# Altium footprint library domino-spring-clamp.PcbLib: 258 footprints (part 4 of 17)
Each footprint in its own frame and in the unit in brackets; x right, y up, seen from the top. Pads: shape width x height; smd on the part's side, far side on the other; paste and mask are expansions set on the pad; w line width, h text height; cw(c..) or ccw(c..) is an arc to the next point about the centre after c.
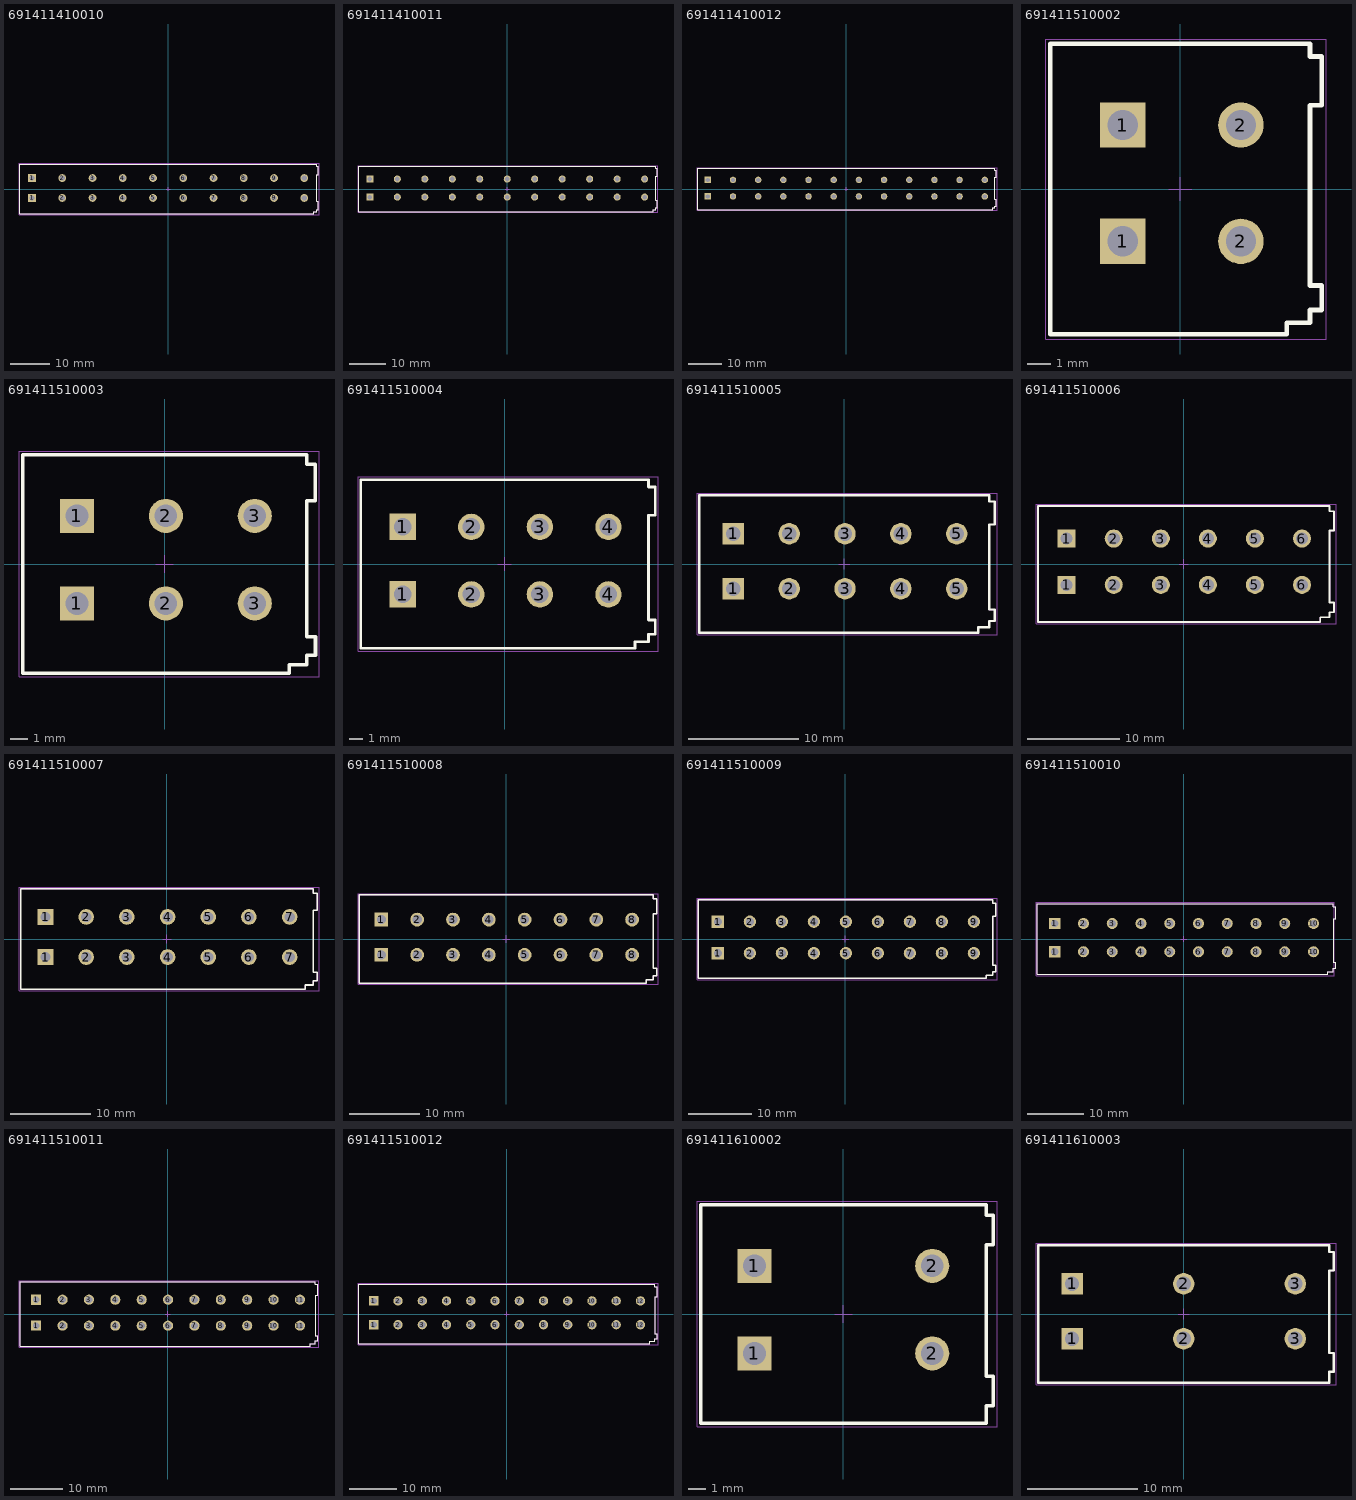
[diagram p3: the footprints below, top view; thin cyan lines are the x and y axes]

## 691411410010 [mm] "7.62 mm Screwless Horizontal Entry, 10p"
height 13.9
pads (20):
  rect 1.95x1.95 hole 1.3: 1(-34.29,-2.25) 1(-34.29,2.75)
  round 1.95 hole 1.3: 2(-26.67,-2.25) 2(-26.67,2.75) 3(-19.05,-2.25) 3(-19.05,2.75) 4(-11.43,-2.25) 4(-11.43,2.75) 5(-3.81,-2.25) 5(-3.81,2.75) 6(3.81,-2.25) 6(3.81,2.75) 7(11.43,-2.25) 7(11.43,2.75) 8(19.05,-2.25) 8(19.05,2.75) 9(26.67,-2.25) 9(26.67,2.75) 10(34.29,-2.25) 10(34.29,2.75)
Top Overlay:
  lines w0.2: -37.37,-6.25 36.71,-6.25 36.71,-5.75 37.37,-5.75 37.37,-5.2 37.79,-5.2 37.79,-3.1 37.37,-3.1 37.37,3.6 37.79,3.6 37.79,5.7 37.37,5.7 37.37,6.25 -37.37,6.25 -37.37,-6.25
Mechanical 13:
  lines w0.1: -37.37,-6.25 -37.37,6.25 37.37,6.25 37.37,5.7 37.79,5.7 37.79,3.6 37.37,3.6 37.37,-3.1 37.79,-3.1 37.79,-5.2 37.37,-5.2 37.37,-5.75 36.71,-5.75 36.71,-6.25 -37.37,-6.25
Mechanical 15:
  lines w0.05: -0.5,0 0.5,0 ; 0,-0.5 0,0.5 ; -37.57,-6.45 -37.57,6.45 37.99,6.45 37.99,-6.45 -37.57,-6.45
3D body "691411410010.stp": height 14, standoff -3.5, extent -37.37,-6.25 37.757,6.25

## 691411410011 [mm] "7.62 mm Screwless Horizontal Entry, 11p"
height 13.9
pads (22):
  rect 1.95x1.95 hole 1.3: 1(-38.1,-2.25) 1(-38.1,2.75)
  round 1.95 hole 1.3: 2(-30.48,-2.25) 2(-30.48,2.75) 3(-22.86,-2.25) 3(-22.86,2.75) 4(-15.24,-2.25) 4(-15.24,2.75) 5(-7.62,-2.25) 5(-7.62,2.75) 6(0,-2.25) 6(0,2.75) 7(7.62,-2.25) 7(7.62,2.75) 8(15.24,-2.25) 8(15.24,2.75) 9(22.86,-2.25) 9(22.86,2.75) 10(30.48,-2.25) 10(30.48,2.75) 11(38.1,-2.25) 11(38.1,2.75)
Top Overlay:
  lines w0.2: -41.18,-6.25 40.52,-6.25 40.52,-5.75 41.18,-5.75 41.18,-5.2 41.6,-5.2 41.6,-3.1 41.18,-3.1 41.18,3.6 41.6,3.6 41.6,5.7 41.18,5.7 41.18,6.25 -41.18,6.25 -41.18,-6.25
Mechanical 13:
  lines w0.1: -41.18,-6.25 -41.18,6.25 41.18,6.25 41.18,5.7 41.6,5.7 41.6,3.6 41.18,3.6 41.18,-3.1 41.6,-3.1 41.6,-5.2 41.18,-5.2 41.18,-5.75 40.52,-5.75 40.52,-6.25 -41.18,-6.25
Mechanical 15:
  lines w0.05: -0.5,0 0.5,0 ; 0,-0.5 0,0.5 ; -41.38,-6.45 -41.38,6.45 41.8,6.45 41.8,-6.45 -41.38,-6.45
3D body "691411410011.stp": height 14, standoff -3.5, extent -41.18,-6.25 41.564,6.25

## 691411410012 [mm] "7.62 mm Screwless Horizontal Entry, 12p"
height 13.9
pads (24):
  rect 1.95x1.95 hole 1.3: 1(-41.91,-2.25) 1(-41.91,2.75)
  round 1.95 hole 1.3: 2(-34.29,-2.25) 2(-34.29,2.75) 3(-26.67,-2.25) 3(-26.67,2.75) 4(-19.05,-2.25) 4(-19.05,2.75) 5(-11.43,-2.25) 5(-11.43,2.75) 6(-3.81,-2.25) 6(-3.81,2.75) 7(3.81,-2.25) 7(3.81,2.75) 8(11.43,-2.25) 8(11.43,2.75) 9(19.05,-2.25) 9(19.05,2.75) 10(26.67,-2.25) 10(26.67,2.75) 11(34.29,-2.25) 11(34.29,2.75) 12(41.91,-2.25) 12(41.91,2.75)
Top Overlay:
  lines w0.2: -44.99,-6.25 44.33,-6.25 44.33,-5.75 44.99,-5.75 44.99,-5.2 45.41,-5.2 45.41,-3.1 44.99,-3.1 44.99,3.6 45.41,3.6 45.41,5.7 44.99,5.7 44.99,6.25 -44.99,6.25 -44.99,-6.25
Mechanical 13:
  lines w0.1: -44.99,-6.25 -44.99,6.25 44.99,6.25 44.99,5.7 45.41,5.7 45.41,3.6 44.99,3.6 44.99,-3.1 45.41,-3.1 45.41,-5.2 44.99,-5.2 44.99,-5.75 44.33,-5.75 44.33,-6.25 -44.99,-6.25
Mechanical 15:
  lines w0.05: -0.5,0 0.5,0 ; 0,-0.5 0,0.5 ; -45.19,-6.45 -45.19,6.45 45.61,6.45 45.61,-6.45 -45.19,-6.45
3D body "691411410012.stp": height 14, standoff -3.5, extent -44.99,-6.25 45.37,6.25

## 691411510002 [mm] "5.08 mm Screwless Horizontal Entry, 2p"
height 13.9
pads (4):
  rect 1.95x1.95 hole 1.3: 1(-2.47,-2.25) 1(-2.47,2.75)
  round 1.95 hole 1.3: 2(2.61,-2.25) 2(2.61,2.75)
Top Overlay:
  lines w0.2: -5.58,-6.25 4.58,-6.25 4.58,-5.75 5.58,-5.75 5.58,-5.2 6.08,-5.2 6.08,-4.15 5.58,-4.15 5.58,3.6 6.08,3.6 6.08,5.7 5.58,5.7 5.58,6.25 -5.58,6.25 -5.58,-6.25
Mechanical 13:
  lines w0.1: -5.58,-6.25 -5.58,6.25 5.58,6.25 5.58,5.7 6.08,5.7 6.08,3.6 5.58,3.6 5.58,-4.15 6.08,-4.15 6.08,-5.2 5.58,-5.2 5.58,-5.75 4.58,-5.75 4.58,-6.25 -5.58,-6.25
Mechanical 15:
  lines w0.05: -0.5,0 0.5,0 ; 0,-0.5 0,0.5 ; -5.78,-6.45 -5.78,6.45 6.28,6.45 6.28,-6.45 -5.78,-6.45
3D body "691411510002.stp": height 13.95, standoff -3.55, extent -5.58,-6.25 6.08,6.25

## 691411510003 [mm] "5.08 mm Screwless Horizontal Entry, 3p"
height 13.9
pads (6):
  rect 1.95x1.95 hole 1.3: 1(-5.01,-2.25) 1(-5.01,2.75)
  round 1.95 hole 1.3: 2(0.07,-2.25) 2(0.07,2.75) 3(5.15,-2.25) 3(5.15,2.75)
Top Overlay:
  lines w0.2: -8.12,-6.25 7.12,-6.25 7.12,-5.75 8.12,-5.75 8.12,-5.2 8.62,-5.2 8.62,-4.15 8.12,-4.15 8.12,3.6 8.62,3.6 8.62,5.7 8.12,5.7 8.12,6.25 -8.12,6.25 -8.12,-6.25
Mechanical 13:
  lines w0.1: -8.12,-6.25 -8.12,6.25 8.12,6.25 8.12,5.7 8.62,5.7 8.62,3.6 8.12,3.6 8.12,-4.15 8.62,-4.15 8.62,-5.2 8.12,-5.2 8.12,-5.75 7.12,-5.75 7.12,-6.25 -8.12,-6.25
Mechanical 15:
  lines w0.05: -0.5,0 0.5,0 ; 0,-0.5 0,0.5 ; -8.32,-6.45 -8.32,6.45 8.82,6.45 8.82,-6.45 -8.32,-6.45
3D body "691411510003.stp": height 13.95, standoff -3.55, extent -8.12,-6.25 8.62,6.25

## 691411510004 [mm] "5.08 mm Screwless Horizontal Entry, 4p"
height 13.9
pads (8):
  rect 1.95x1.95 hole 1.3: 1(-7.55,-2.25) 1(-7.55,2.75)
  round 1.95 hole 1.3: 2(-2.47,-2.25) 2(-2.47,2.75) 3(2.61,-2.25) 3(2.61,2.75) 4(7.69,-2.25) 4(7.69,2.75)
Top Overlay:
  lines w0.2: -10.66,-6.25 9.66,-6.25 9.66,-5.75 10.66,-5.75 10.66,-5.2 11.16,-5.2 11.16,-4.15 10.66,-4.15 10.66,3.6 11.16,3.6 11.16,5.7 10.66,5.7 10.66,6.25 -10.66,6.25 -10.66,-6.25
Mechanical 13:
  lines w0.1: -10.66,-6.25 -10.66,6.25 10.66,6.25 10.66,5.7 11.16,5.7 11.16,3.6 10.66,3.6 10.66,-4.15 11.16,-4.15 11.16,-5.2 10.66,-5.2 10.66,-5.75 9.66,-5.75 9.66,-6.25 -10.66,-6.25
Mechanical 15:
  lines w0.05: -0.5,0 0.5,0 ; 0,-0.5 0,0.5 ; -10.86,-6.45 -10.86,6.45 11.36,6.45 11.36,-6.45 -10.86,-6.45
3D body "691411510004.stp": height 13.95, standoff -3.55, extent -10.66,-6.25 11.16,6.25

## 691411510005 [mm] "5.08 mm Screwless Horizontal Entry, 5p"
height 13.9
pads (10):
  rect 1.95x1.95 hole 1.3: 1(-10.09,-2.25) 1(-10.09,2.75)
  round 1.95 hole 1.3: 2(-5.01,-2.25) 2(-5.01,2.75) 3(0.07,-2.25) 3(0.07,2.75) 4(5.15,-2.25) 4(5.15,2.75) 5(10.23,-2.25) 5(10.23,2.75)
Top Overlay:
  lines w0.2: -13.2,-6.25 12.2,-6.25 12.2,-5.75 13.2,-5.75 13.2,-5.2 13.7,-5.2 13.7,-4.15 13.2,-4.15 13.2,3.6 13.7,3.6 13.7,5.7 13.2,5.7 13.2,6.25 -13.2,6.25 -13.2,-6.25
Mechanical 13:
  lines w0.1: -13.2,-6.25 -13.2,6.25 13.2,6.25 13.2,5.7 13.7,5.7 13.7,3.6 13.2,3.6 13.2,-4.15 13.7,-4.15 13.7,-5.2 13.2,-5.2 13.2,-5.75 12.2,-5.75 12.2,-6.25 -13.2,-6.25
Mechanical 15:
  lines w0.05: -0.5,0 0.5,0 ; 0,-0.5 0,0.5 ; -13.4,-6.45 -13.4,6.45 13.9,6.45 13.9,-6.45 -13.4,-6.45
3D body "691411510005.stp": height 13.95, standoff -3.55, extent -13.2,-6.25 13.7,6.25

## 691411510006 [mm] "5.08 mm Screwless Horizontal Entry, 6p"
height 13.9
pads (12):
  rect 1.95x1.95 hole 1.3: 1(-12.63,-2.25) 1(-12.63,2.75)
  round 1.95 hole 1.3: 2(-7.55,-2.25) 2(-7.55,2.75) 3(-2.47,-2.25) 3(-2.47,2.75) 4(2.61,-2.25) 4(2.61,2.75) 5(7.69,-2.25) 5(7.69,2.75) 6(12.77,-2.25) 6(12.77,2.75)
Top Overlay:
  lines w0.2: -15.74,-6.25 -15.74,6.25 15.74,6.25 15.74,5.7 16.24,5.7 16.24,3.6 15.74,3.6 15.74,-4.15 16.24,-4.15 16.24,-5.2 15.74,-5.2 15.74,-5.75 14.74,-5.75 14.74,-6.25 -15.74,-6.25
Mechanical 13:
  lines w0.1: -15.74,-6.25 14.74,-6.25 14.74,-5.75 15.74,-5.75 15.74,-5.2 16.24,-5.2 16.24,-4.15 15.74,-4.15 15.74,3.6 16.24,3.6 16.24,5.7 15.74,5.7 15.74,6.25 -15.74,6.25 -15.74,-6.25
Mechanical 15:
  lines w0.05: -0.5,0 0.5,0 ; 0,-0.5 0,0.5 ; -15.94,-6.45 16.44,-6.45 16.44,6.45 -15.94,6.45 -15.94,-6.45
3D body "691411510006.stp": height 13.95, standoff -3.55, extent -15.74,-6.25 16.24,6.25

## 691411510007 [mm] "5.08 mm Screwless Horizontal Entry, 7p"
height 13.9
pads (14):
  rect 1.95x1.95 hole 1.3: 1(-15.17,-2.25) 1(-15.17,2.75)
  round 1.95 hole 1.3: 2(-10.09,-2.25) 2(-10.09,2.75) 3(-5.01,-2.25) 3(-5.01,2.75) 4(0.07,-2.25) 4(0.07,2.75) 5(5.15,-2.25) 5(5.15,2.75) 6(10.23,-2.25) 6(10.23,2.75) 7(15.31,-2.25) 7(15.31,2.75)
Top Overlay:
  lines w0.2: -18.28,-6.25 -18.28,6.25 18.28,6.25 18.28,5.7 18.78,5.7 18.78,3.6 18.28,3.6 18.28,-4.15 18.78,-4.15 18.78,-5.2 18.28,-5.2 18.28,-5.75 17.28,-5.75 17.28,-6.25 -18.28,-6.25
Mechanical 13:
  lines w0.1: -18.28,-6.25 17.28,-6.25 17.28,-5.75 18.28,-5.75 18.28,-5.2 18.78,-5.2 18.78,-4.15 18.28,-4.15 18.28,3.6 18.78,3.6 18.78,5.7 18.28,5.7 18.28,6.25 -18.28,6.25 -18.28,-6.25
Mechanical 15:
  lines w0.05: -0.5,0 0.5,0 ; 0,-0.5 0,0.5 ; -18.48,-6.45 18.98,-6.45 18.98,6.45 -18.48,6.45 -18.48,-6.45
3D body "691411510007.stp": height 13.95, standoff -3.55, extent -18.28,-6.25 18.78,6.25

## 691411510008 [mm] "5.08 mm Screwless Horizontal Entry, 8p"
height 13.9
pads (16):
  rect 1.95x1.95 hole 1.3: 1(-17.71,-2.25) 1(-17.71,2.75)
  round 1.95 hole 1.3: 2(-12.63,-2.25) 2(-12.63,2.75) 3(-7.55,-2.25) 3(-7.55,2.75) 4(-2.47,-2.25) 4(-2.47,2.75) 5(2.61,-2.25) 5(2.61,2.75) 6(7.69,-2.25) 6(7.69,2.75) 7(12.77,-2.25) 7(12.77,2.75) 8(17.85,-2.25) 8(17.85,2.75)
Top Overlay:
  lines w0.2: -20.82,-6.25 19.82,-6.25 19.82,-5.75 20.82,-5.75 20.82,-5.2 21.32,-5.2 21.32,-4.15 20.82,-4.15 20.82,3.6 21.32,3.6 21.32,5.7 20.82,5.7 20.82,6.25 -20.82,6.25 -20.82,-6.25
Mechanical 13:
  lines w0.1: -20.82,-6.25 -20.82,6.25 20.82,6.25 20.82,5.7 21.32,5.7 21.32,3.6 20.82,3.6 20.82,-4.15 21.32,-4.15 21.32,-5.2 20.82,-5.2 20.82,-5.75 19.82,-5.75 19.82,-6.25 -20.82,-6.25
Mechanical 15:
  lines w0.05: -0.5,0 0.5,0 ; 0,-0.5 0,0.5 ; -21.02,-6.45 -21.02,6.45 21.52,6.45 21.52,-6.45 -21.02,-6.45
3D body "691411510008.stp": height 13.95, standoff -3.55, extent -20.82,-6.25 21.32,6.25

## 691411510009 [mm] "5.08 mm Screwless Horizontal Entry, 9p"
height 13.9
pads (18):
  rect 1.95x1.95 hole 1.3: 1(-20.25,-2.25) 1(-20.25,2.75)
  round 1.95 hole 1.3: 2(-15.17,-2.25) 2(-15.17,2.75) 3(-10.09,-2.25) 3(-10.09,2.75) 4(-5.01,-2.25) 4(-5.01,2.75) 5(0.07,-2.25) 5(0.07,2.75) 6(5.15,-2.25) 6(5.15,2.75) 7(10.23,-2.25) 7(10.23,2.75) 8(15.31,-2.25) 8(15.31,2.75) 9(20.39,-2.25) 9(20.39,2.75)
Top Overlay:
  lines w0.2: -23.36,-6.25 -23.36,6.25 23.36,6.25 23.36,5.7 23.86,5.7 23.86,3.6 23.36,3.6 23.36,-4.15 23.86,-4.15 23.86,-5.2 23.36,-5.2 23.36,-5.75 22.36,-5.75 22.36,-6.25 -23.36,-6.25
Mechanical 13:
  lines w0.1: -23.36,-6.25 22.36,-6.25 22.36,-5.75 23.36,-5.75 23.36,-5.2 23.86,-5.2 23.86,-4.15 23.36,-4.15 23.36,3.6 23.86,3.6 23.86,5.7 23.36,5.7 23.36,6.25 -23.36,6.25 -23.36,-6.25
Mechanical 15:
  lines w0.05: -0.5,0 0.5,0 ; 0,-0.5 0,0.5 ; -23.56,-6.45 24.06,-6.45 24.06,6.45 -23.56,6.45 -23.56,-6.45
3D body "691411510009.stp": height 13.95, standoff -3.55, extent -23.36,-6.25 23.86,6.25

## 691411510010 [mm] "5.08 mm Screwless Horizontal Entry, 10p"
height 13.9
pads (20):
  rect 1.95x1.95 hole 1.3: 1(-22.79,-2.25) 1(-22.79,2.75)
  round 1.95 hole 1.3: 2(-17.71,-2.25) 2(-17.71,2.75) 3(-12.63,-2.25) 3(-12.63,2.75) 4(-7.55,-2.25) 4(-7.55,2.75) 5(-2.47,-2.25) 5(-2.47,2.75) 6(2.61,-2.25) 6(2.61,2.75) 7(7.69,-2.25) 7(7.69,2.75) 8(12.77,-2.25) 8(12.77,2.75) 9(17.85,-2.25) 9(17.85,2.75) 10(22.93,-2.25) 10(22.93,2.75)
Top Overlay:
  lines w0.2: -25.9,-6.25 25.4,-6.25 25.4,-5.75 26.4,-5.75 26.4,-5.2 26.9,-5.2 26.9,-4.15 26.4,-4.15 26.4,3.6 26.9,3.6 26.9,5.7 26.4,5.7 26.4,6.25 -25.9,6.25 -25.9,-6.25
Mechanical 13:
  lines w0.1: -25.9,-6.25 -25.9,6.25 26.4,6.25 26.4,5.7 26.9,5.7 26.9,3.6 26.4,3.6 26.4,-4.15 26.9,-4.15 26.9,-5.2 26.4,-5.2 26.4,-5.75 25.4,-5.75 25.4,-6.25 -25.9,-6.25
Mechanical 15:
  lines w0.05: -0.5,0 0.5,0 ; 0,-0.5 0,0.5 ; -26.1,-6.45 -26.1,6.45 26.6,6.45 26.6,-6.45 -26.1,-6.45
3D body "691411510010.stp": height 13.95, standoff -3.55, extent -25.9,-6.25 26.4,6.25

## 691411510011 [mm] "5.08 mm Screwless Horizontal Entry, 11p"
height 13.9
pads (22):
  rect 1.95x1.95 hole 1.3: 1(-25.33,-2.25) 1(-25.33,2.75)
  round 1.95 hole 1.3: 2(-20.25,-2.25) 2(-20.25,2.75) 3(-15.17,-2.25) 3(-15.17,2.75) 4(-10.09,-2.25) 4(-10.09,2.75) 5(-5.01,-2.25) 5(-5.01,2.75) 6(0.07,-2.25) 6(0.07,2.75) 7(5.15,-2.25) 7(5.15,2.75) 8(10.23,-2.25) 8(10.23,2.75) 9(15.31,-2.25) 9(15.31,2.75) 10(20.39,-2.25) 10(20.39,2.75) 11(25.47,-2.25) 11(25.47,2.75)
Top Overlay:
  lines w0.2: -28.44,-6.25 -28.44,6.25 28.44,6.25 28.44,5.7 28.94,5.7 28.94,3.6 28.44,3.6 28.44,-4.15 28.94,-4.15 28.94,-5.2 28.44,-5.2 28.44,-5.75 27.44,-5.75 27.44,-6.25 -28.44,-6.25
Mechanical 13:
  lines w0.1: -28.44,-6.25 27.44,-6.25 27.44,-5.75 28.44,-5.75 28.44,-5.2 28.94,-5.2 28.94,-4.15 28.44,-4.15 28.44,3.6 28.94,3.6 28.94,5.7 28.44,5.7 28.44,6.25 -28.44,6.25 -28.44,-6.25
Mechanical 15:
  lines w0.05: -0.5,0 0.5,0 ; 0,-0.5 0,0.5 ; -28.64,-6.45 29.14,-6.45 29.14,6.45 -28.64,6.45 -28.64,-6.45
3D body "691411510011.stp": height 13.95, standoff -3.55, extent -28.44,-6.25 28.94,6.25

## 691411510012 [mm] "5.08 mm Screwless Horizontal Entry, 12p"
height 13.9
pads (24):
  rect 1.95x1.95 hole 1.3: 1(-27.87,-2.25) 1(-27.87,2.75)
  round 1.95 hole 1.3: 2(-22.79,-2.25) 2(-22.79,2.75) 3(-17.71,-2.25) 3(-17.71,2.75) 4(-12.63,-2.25) 4(-12.63,2.75) 5(-7.55,-2.25) 5(-7.55,2.75) 6(-2.47,-2.25) 6(-2.47,2.75) 7(2.61,-2.25) 7(2.61,2.75) 8(7.69,-2.25) 8(7.69,2.75) 9(12.77,-2.25) 9(12.77,2.75) 10(17.85,-2.25) 10(17.85,2.75) 11(22.93,-2.25) 11(22.93,2.75) 12(28.01,-2.25) 12(28.01,2.75)
Top Overlay:
  lines w0.2: -30.98,-6.25 29.98,-6.25 29.98,-5.75 30.98,-5.75 30.98,-5.2 31.48,-5.2 31.48,-4.15 30.98,-4.15 30.98,3.6 31.48,3.6 31.48,5.7 30.98,5.7 30.98,6.25 -30.98,6.25 -30.98,-6.25
Mechanical 13:
  lines w0.1: -30.98,-6.25 -30.98,6.25 30.98,6.25 30.98,5.7 31.48,5.7 31.48,3.6 30.98,3.6 30.98,-4.15 31.48,-4.15 31.48,-5.2 30.98,-5.2 30.98,-5.75 29.98,-5.75 29.98,-6.25 -30.98,-6.25
Mechanical 15:
  lines w0.05: -0.5,0 0.5,0 ; 0,-0.5 0,0.5 ; -31.18,-6.45 -31.18,6.45 31.68,6.45 31.68,-6.45 -31.18,-6.45
3D body "691411510012.stp": height 13.95, standoff -3.55, extent -30.98,-6.25 31.48,6.25

## 691411610002 [mm] "10.16mm Horizontal Cable Entry Screwless, 02p"
height 13.9
pads (4):
  rect 1.95x1.95 hole 1.3: 1(-5.08,-2.25) 1(-5.08,2.75)
  round 1.95 hole 1.3: 2(5.08,-2.25) 2(5.08,2.75)
Top Overlay:
  lines w0.2: -8.16,-6.25 8.16,-6.25 8.16,-5.25 8.58,-5.25 8.58,-3.55 8.16,-3.55 8.16,3.95 8.58,3.95 8.58,5.65 8.16,5.65 8.16,6.25 -8.16,6.25 -8.16,-6.25
Mechanical 13:
  lines w0.1: -8.16,-6.25 -8.16,6.25 8.16,6.25 8.16,5.65 8.58,5.65 8.58,3.95 8.16,3.95 8.16,-3.55 8.58,-3.55 8.58,-5.25 8.16,-5.25 8.16,-6.25 -8.16,-6.25
Mechanical 15:
  lines w0.05: -0.5,0 0.5,0 ; 0,-0.5 0,0.5 ; -8.36,-6.45 -8.36,6.45 8.78,6.45 8.78,-6.45 -8.36,-6.45
3D body "691411610002.stp": height 14, standoff -3.5, extent -8.16,-6.25 8.579,6.25

## 691411610003 [mm] "10.16mm Horizontal Cable Entry Screwless, 03p"
height 13.9
pads (6):
  rect 1.95x1.95 hole 1.3: 1(-10.16,-2.25) 1(-10.16,2.75)
  round 1.95 hole 1.3: 2(0,-2.25) 2(0,2.75) 3(10.16,-2.25) 3(10.16,2.75)
Top Overlay:
  lines w0.2: -13.24,-6.25 13.24,-6.25 13.24,-5.25 13.66,-5.25 13.66,-3.55 13.24,-3.55 13.24,3.95 13.66,3.95 13.66,5.65 13.24,5.65 13.24,6.25 -13.24,6.25 -13.24,-6.25
Mechanical 13:
  lines w0.1: -13.24,-6.25 -13.24,6.25 13.24,6.25 13.24,5.65 13.66,5.65 13.66,3.95 13.24,3.95 13.24,-3.55 13.66,-3.55 13.66,-5.25 13.24,-5.25 13.24,-6.25 -13.24,-6.25
Mechanical 15:
  lines w0.05: -0.5,0 0.5,0 ; 0,-0.5 0,0.5 ; -13.44,-6.45 -13.44,6.45 13.86,6.45 13.86,-6.45 -13.44,-6.45
3D body "691411610003.stp": height 14, standoff -3.5, extent -13.24,-6.25 13.577,6.25